# Altium footprint library 2020-09-26_17-27-19.PcbLib: 69 footprints (part 3 of 5)
Each footprint in its own frame and in the unit in brackets; x right, y up, seen from the top. Pads: shape width x height; smd on the part's side, far side on the other; paste and mask are expansions set on the pad; w line width, h text height; cw(c..) or ccw(c..) is an arc to the next point about the centre after c.
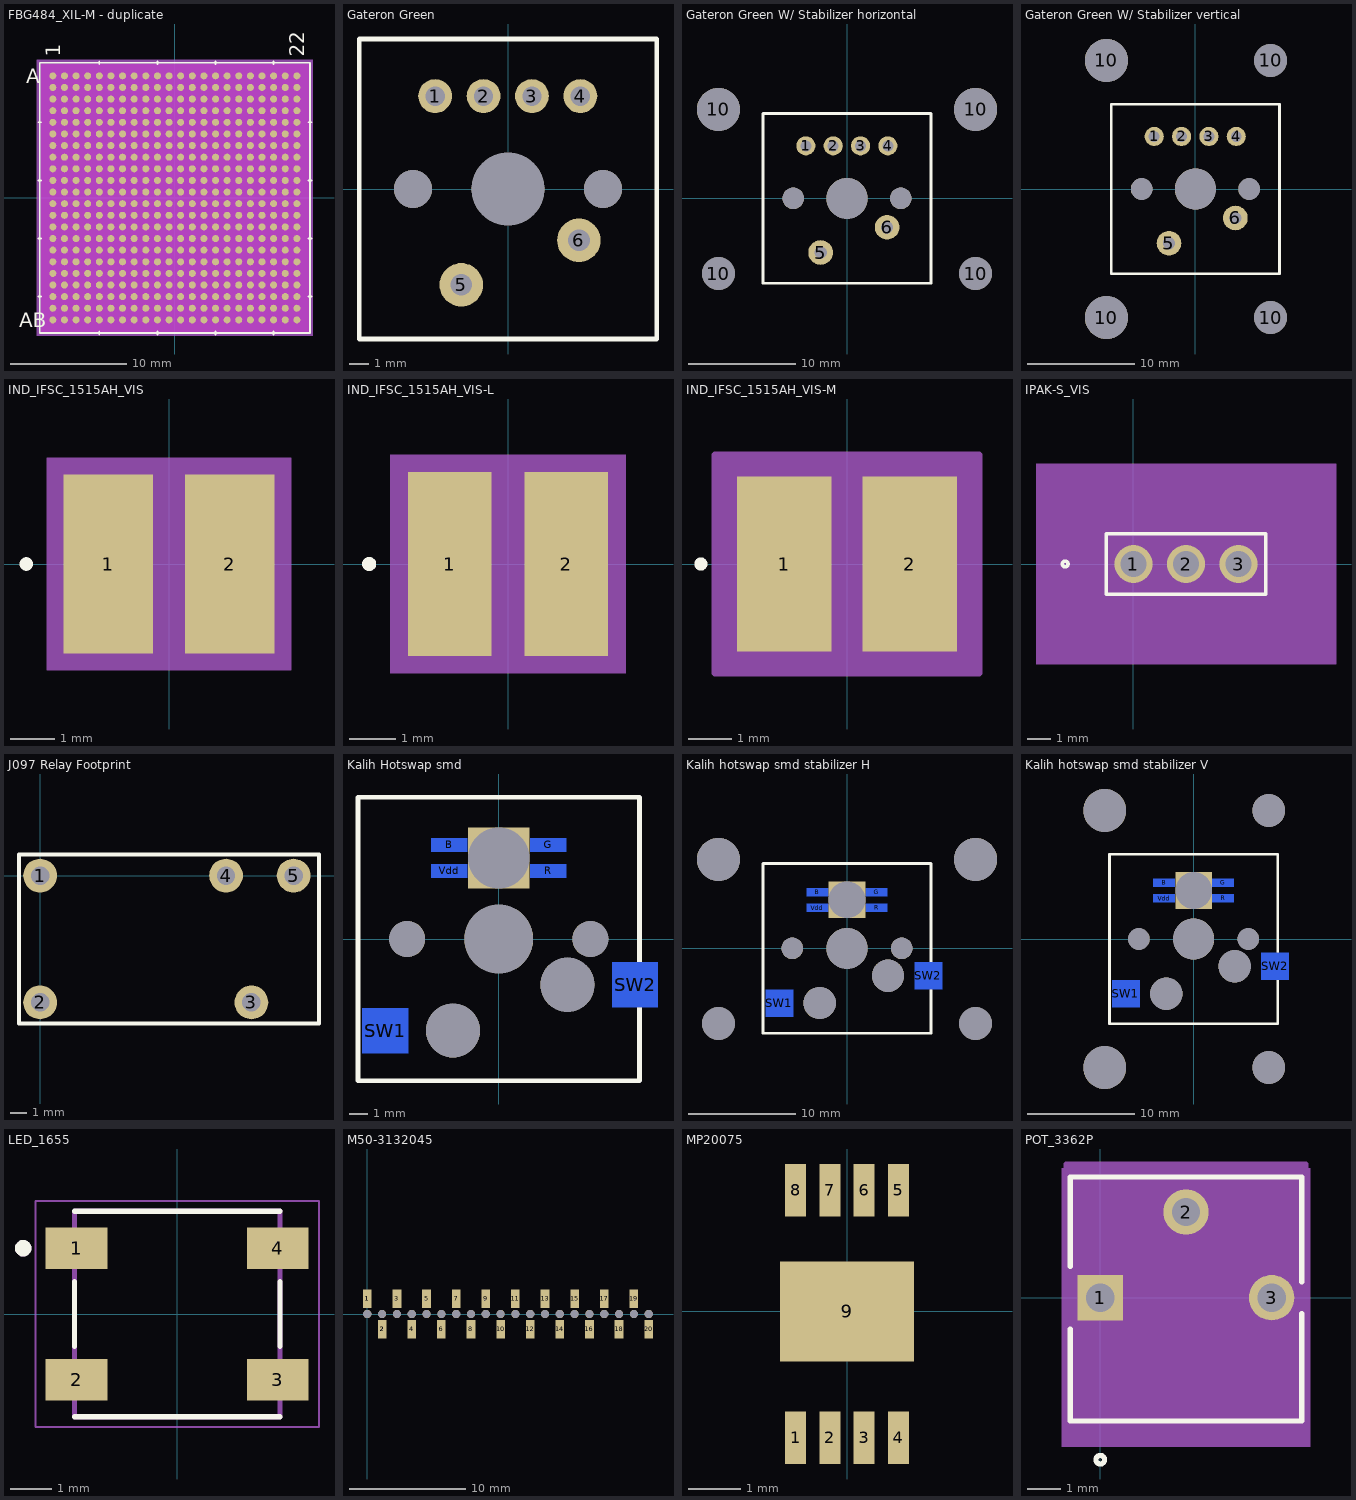
[diagram p2: the footprints below, top view; thin cyan lines are the x and y axes]

## FBG484_XIL-M - duplicate [mm]
pads (484):
  round 0.605 smd paste+0 mask+0: A1(-10.5,10.5) A2(-9.5,10.5) A3(-8.5,10.5) A4(-7.5,10.5) A5(-6.5,10.5) A6(-5.5,10.5) A7(-4.5,10.5) A8(-3.5,10.5) A9(-2.5,10.5) A10(-1.5,10.5) A11(-0.5,10.5) A12(0.5,10.5) A13(1.5,10.5) A14(2.5,10.5) A15(3.5,10.5) A16(4.5,10.5) A17(5.5,10.5) A18(6.5,10.5) A19(7.5,10.5) A20(8.5,10.5) A21(9.5,10.5) A22(10.5,10.5) AA1(-10.5,-9.5) AA2(-9.5,-9.5) AA3(-8.5,-9.5) AA4(-7.5,-9.5) AA5(-6.5,-9.5) AA6(-5.5,-9.5) AA7(-4.5,-9.5) AA8(-3.5,-9.5) AA9(-2.5,-9.5) AA10(-1.5,-9.5) AA11(-0.5,-9.5) AA12(0.5,-9.5) AA13(1.5,-9.5) AA14(2.5,-9.5) AA15(3.5,-9.5) AA16(4.5,-9.5) AA17(5.5,-9.5) AA18(6.5,-9.5) AA19(7.5,-9.5) AA20(8.5,-9.5) AA21(9.5,-9.5) AA22(10.5,-9.5) AB1(-10.5,-10.5) AB2(-9.5,-10.5) AB3(-8.5,-10.5) AB4(-7.5,-10.5) AB5(-6.5,-10.5) AB6(-5.5,-10.5) AB7(-4.5,-10.5) AB8(-3.5,-10.5) AB9(-2.5,-10.5) AB10(-1.5,-10.5) AB11(-0.5,-10.5) AB12(0.5,-10.5) AB13(1.5,-10.5) AB14(2.5,-10.5) AB15(3.5,-10.5) AB16(4.5,-10.5) AB17(5.5,-10.5) AB18(6.5,-10.5) AB19(7.5,-10.5) AB20(8.5,-10.5) AB21(9.5,-10.5) AB22(10.5,-10.5) B1(-10.5,9.5) B2(-9.5,9.5) B3(-8.5,9.5) B4(-7.5,9.5) B5(-6.5,9.5) B6(-5.5,9.5) B7(-4.5,9.5) B8(-3.5,9.5) B9(-2.5,9.5) B10(-1.5,9.5) B11(-0.5,9.5) B12(0.5,9.5) B13(1.5,9.5) B14(2.5,9.5) B15(3.5,9.5) B16(4.5,9.5) B17(5.5,9.5) B18(6.5,9.5) B19(7.5,9.5) B20(8.5,9.5) B21(9.5,9.5) B22(10.5,9.5) C1(-10.5,8.5) C2(-9.5,8.5) C3(-8.5,8.5) C4(-7.5,8.5) C5(-6.5,8.5) C6(-5.5,8.5) C7(-4.5,8.5) C8(-3.5,8.5) C9(-2.5,8.5) C10(-1.5,8.5) C11(-0.5,8.5) C12(0.5,8.5) C13(1.5,8.5) C14(2.5,8.5) C15(3.5,8.5) C16(4.5,8.5) C17(5.5,8.5) C18(6.5,8.5) C19(7.5,8.5) C20(8.5,8.5) C21(9.5,8.5) C22(10.5,8.5) D1(-10.5,7.5) D2(-9.5,7.5) D3(-8.5,7.5) D4(-7.5,7.5) D5(-6.5,7.5) D6(-5.5,7.5) D7(-4.5,7.5) D8(-3.5,7.5) D9(-2.5,7.5) D10(-1.5,7.5) D11(-0.5,7.5) D12(0.5,7.5) D13(1.5,7.5) D14(2.5,7.5) D15(3.5,7.5) D16(4.5,7.5) D17(5.5,7.5) D18(6.5,7.5) D19(7.5,7.5) D20(8.5,7.5) D21(9.5,7.5) D22(10.5,7.5) E1(-10.5,6.5) E2(-9.5,6.5) E3(-8.5,6.5) E4(-7.5,6.5) E5(-6.5,6.5) E6(-5.5,6.5) E7(-4.5,6.5) E8(-3.5,6.5) E9(-2.5,6.5) E10(-1.5,6.5) E11(-0.5,6.5) E12(0.5,6.5) E13(1.5,6.5) E14(2.5,6.5) E15(3.5,6.5) E16(4.5,6.5) E17(5.5,6.5) E18(6.5,6.5) E19(7.5,6.5) E20(8.5,6.5) E21(9.5,6.5) E22(10.5,6.5) F1(-10.5,5.5) F2(-9.5,5.5) F3(-8.5,5.5) F4(-7.5,5.5) F5(-6.5,5.5) F6(-5.5,5.5) F7(-4.5,5.5) F8(-3.5,5.5) F9(-2.5,5.5) F10(-1.5,5.5) F11(-0.5,5.5) F12(0.5,5.5) F13(1.5,5.5) F14(2.5,5.5) F15(3.5,5.5) F16(4.5,5.5) F17(5.5,5.5) F18(6.5,5.5) F19(7.5,5.5) F20(8.5,5.5) F21(9.5,5.5) F22(10.5,5.5) G1(-10.5,4.5) G2(-9.5,4.5) G3(-8.5,4.5) G4(-7.5,4.5) G5(-6.5,4.5) G6(-5.5,4.5) G7(-4.5,4.5) G8(-3.5,4.5) G9(-2.5,4.5) G10(-1.5,4.5) G11(-0.5,4.5) G12(0.5,4.5) G13(1.5,4.5) G14(2.5,4.5) G15(3.5,4.5) G16(4.5,4.5) G17(5.5,4.5) G18(6.5,4.5) G19(7.5,4.5) G20(8.5,4.5) G21(9.5,4.5) G22(10.5,4.5) H1(-10.5,3.5) H2(-9.5,3.5) H3(-8.5,3.5) H4(-7.5,3.5) H5(-6.5,3.5) H6(-5.5,3.5) H7(-4.5,3.5) H8(-3.5,3.5) H9(-2.5,3.5) H10(-1.5,3.5) H11(-0.5,3.5) H12(0.5,3.5) H13(1.5,3.5) H14(2.5,3.5) H15(3.5,3.5) H16(4.5,3.5) H17(5.5,3.5) H18(6.5,3.5) H19(7.5,3.5) H20(8.5,3.5) H21(9.5,3.5) H22(10.5,3.5) J1(-10.5,2.5) J2(-9.5,2.5) J3(-8.5,2.5) J4(-7.5,2.5) J5(-6.5,2.5) J6(-5.5,2.5) J7(-4.5,2.5) J8(-3.5,2.5) J9(-2.5,2.5) J10(-1.5,2.5) J11(-0.5,2.5) J12(0.5,2.5) J13(1.5,2.5) J14(2.5,2.5) J15(3.5,2.5) J16(4.5,2.5) J17(5.5,2.5) J18(6.5,2.5) J19(7.5,2.5) J20(8.5,2.5) J21(9.5,2.5) J22(10.5,2.5) K1(-10.5,1.5) K2(-9.5,1.5) K3(-8.5,1.5) K4(-7.5,1.5) K5(-6.5,1.5) K6(-5.5,1.5) K7(-4.5,1.5) K8(-3.5,1.5) K9(-2.5,1.5) K10(-1.5,1.5) K11(-0.5,1.5) K12(0.5,1.5) K13(1.5,1.5) K14(2.5,1.5) K15(3.5,1.5) K16(4.5,1.5) K17(5.5,1.5) K18(6.5,1.5) K19(7.5,1.5) K20(8.5,1.5) K21(9.5,1.5) K22(10.5,1.5) L1(-10.5,0.5) L2(-9.5,0.5) L3(-8.5,0.5) L4(-7.5,0.5) L5(-6.5,0.5) L6(-5.5,0.5) L7(-4.5,0.5) L8(-3.5,0.5) L9(-2.5,0.5) L10(-1.5,0.5) L11(-0.5,0.5) L12(0.5,0.5) L13(1.5,0.5) L14(2.5,0.5) L15(3.5,0.5) L16(4.5,0.5) L17(5.5,0.5) L18(6.5,0.5) L19(7.5,0.5) L20(8.5,0.5) L21(9.5,0.5) L22(10.5,0.5) M1(-10.5,-0.5) M2(-9.5,-0.5) M3(-8.5,-0.5) M4(-7.5,-0.5) M5(-6.5,-0.5) M6(-5.5,-0.5) M7(-4.5,-0.5) M8(-3.5,-0.5) M9(-2.5,-0.5) M10(-1.5,-0.5) M11(-0.5,-0.5) M12(0.5,-0.5) M13(1.5,-0.5) M14(2.5,-0.5) M15(3.5,-0.5) M16(4.5,-0.5) M17(5.5,-0.5) M18(6.5,-0.5) M19(7.5,-0.5) M20(8.5,-0.5) M21(9.5,-0.5) M22(10.5,-0.5) N1(-10.5,-1.5) N2(-9.5,-1.5) N3(-8.5,-1.5) N4(-7.5,-1.5) N5(-6.5,-1.5) N6(-5.5,-1.5) N7(-4.5,-1.5) N8(-3.5,-1.5) N9(-2.5,-1.5) N10(-1.5,-1.5) N11(-0.5,-1.5) N12(0.5,-1.5) N13(1.5,-1.5) N14(2.5,-1.5) N15(3.5,-1.5) N16(4.5,-1.5) N17(5.5,-1.5) N18(6.5,-1.5) N19(7.5,-1.5) N20(8.5,-1.5) N21(9.5,-1.5) N22(10.5,-1.5) P1(-10.5,-2.5) P2(-9.5,-2.5) P3(-8.5,-2.5) P4(-7.5,-2.5) P5(-6.5,-2.5) P6(-5.5,-2.5) P7(-4.5,-2.5) P8(-3.5,-2.5) P9(-2.5,-2.5) P10(-1.5,-2.5) P11(-0.5,-2.5) P12(0.5,-2.5) P13(1.5,-2.5) P14(2.5,-2.5) P15(3.5,-2.5) P16(4.5,-2.5) P17(5.5,-2.5) P18(6.5,-2.5) P19(7.5,-2.5) P20(8.5,-2.5) P21(9.5,-2.5) P22(10.5,-2.5) R1(-10.5,-3.5) R2(-9.5,-3.5) R3(-8.5,-3.5) R4(-7.5,-3.5) R5(-6.5,-3.5) R6(-5.5,-3.5) R7(-4.5,-3.5) R8(-3.5,-3.5) R9(-2.5,-3.5) R10(-1.5,-3.5) R11(-0.5,-3.5) R12(0.5,-3.5) R13(1.5,-3.5) R14(2.5,-3.5) R15(3.5,-3.5) R16(4.5,-3.5) R17(5.5,-3.5) R18(6.5,-3.5) R19(7.5,-3.5) R20(8.5,-3.5) R21(9.5,-3.5) R22(10.5,-3.5) T1(-10.5,-4.5) T2(-9.5,-4.5) T3(-8.5,-4.5) T4(-7.5,-4.5) T5(-6.5,-4.5) T6(-5.5,-4.5) T7(-4.5,-4.5) T8(-3.5,-4.5) T9(-2.5,-4.5) T10(-1.5,-4.5) T11(-0.5,-4.5) T12(0.5,-4.5) T13(1.5,-4.5) T14(2.5,-4.5) T15(3.5,-4.5) T16(4.5,-4.5) T17(5.5,-4.5) T18(6.5,-4.5) T19(7.5,-4.5) T20(8.5,-4.5) T21(9.5,-4.5) T22(10.5,-4.5) U1(-10.5,-5.5) U2(-9.5,-5.5) U3(-8.5,-5.5) U4(-7.5,-5.5) U5(-6.5,-5.5) U6(-5.5,-5.5) U7(-4.5,-5.5) U8(-3.5,-5.5) U9(-2.5,-5.5) U10(-1.5,-5.5) U11(-0.5,-5.5) U12(0.5,-5.5) U13(1.5,-5.5) U14(2.5,-5.5) U15(3.5,-5.5) U16(4.5,-5.5) U17(5.5,-5.5) U18(6.5,-5.5) U19(7.5,-5.5) U20(8.5,-5.5) U21(9.5,-5.5) U22(10.5,-5.5) V1(-10.5,-6.5) V2(-9.5,-6.5) V3(-8.5,-6.5) V4(-7.5,-6.5) V5(-6.5,-6.5) V6(-5.5,-6.5) V7(-4.5,-6.5) V8(-3.5,-6.5) V9(-2.5,-6.5) V10(-1.5,-6.5) V11(-0.5,-6.5) V12(0.5,-6.5) V13(1.5,-6.5) V14(2.5,-6.5) V15(3.5,-6.5) V16(4.5,-6.5) V17(5.5,-6.5) V18(6.5,-6.5) V19(7.5,-6.5) V20(8.5,-6.5) V21(9.5,-6.5) V22(10.5,-6.5) W1(-10.5,-7.5) W2(-9.5,-7.5) W3(-8.5,-7.5) W4(-7.5,-7.5) W5(-6.5,-7.5) W6(-5.5,-7.5) W7(-4.5,-7.5) W8(-3.5,-7.5) W9(-2.5,-7.5) W10(-1.5,-7.5) W11(-0.5,-7.5) W12(0.5,-7.5) W13(1.5,-7.5) W14(2.5,-7.5) W15(3.5,-7.5) W16(4.5,-7.5) W17(5.5,-7.5) W18(6.5,-7.5) W19(7.5,-7.5) W20(8.5,-7.5) W21(9.5,-7.5) W22(10.5,-7.5) Y1(-10.5,-8.5) Y2(-9.5,-8.5) Y3(-8.5,-8.5) Y4(-7.5,-8.5) Y5(-6.5,-8.5) Y6(-5.5,-8.5) Y7(-4.5,-8.5) Y8(-3.5,-8.5) Y9(-2.5,-8.5) Y10(-1.5,-8.5) Y11(-0.5,-8.5) Y12(0.5,-8.5) Y13(1.5,-8.5) Y14(2.5,-8.5) Y15(3.5,-8.5) Y16(4.5,-8.5) Y17(5.5,-8.5) Y18(6.5,-8.5) Y19(7.5,-8.5) Y20(8.5,-8.5) Y21(9.5,-8.5) Y22(10.5,-8.5)
Top Overlay:
  lines w0.152: -11.76,-8.5 -11.506,-8.5 ; -11.76,-3.5 -11.506,-3.5 ; -11.76,1.5 -11.506,1.5 ; -11.76,6.5 -11.506,6.5 ; -6.5,-11.76 -6.5,-11.506 ; -6.5,11.506 -6.5,11.76 ; -1.5,-11.76 -1.5,-11.506 ; -1.5,11.506 -1.5,11.76 ; 3.5,-11.76 3.5,-11.506 ; 3.5,11.506 3.5,11.76 ; 8.5,-11.76 8.5,-11.506 ; 8.5,11.506 8.5,11.76 ; 11.506,-8.5 11.76,-8.5 ; 11.506,-3.5 11.76,-3.5 ; 11.506,1.5 11.76,1.5 ; 11.506,6.5 11.76,6.5 ; -11.633,-11.633 -11.633,11.633 11.633,11.633 11.633,-11.633 -11.633,-11.633
  text "22" at 11.135,12.141 h1.27
  text "1" at -9.865,12.141 h1.27
  text "AB" at -13.411,-11.135 h1.27
  text "A" at -12.776,9.865 h1.27
Bottom Overlay:
  text "22" at 9.865,12.141 h1.27
  text "1" at -11.135,12.141 h1.27
  text "AB" at -12.141,-11.135 h1.27
  text "A" at -12.141,9.865 h1.27
Keep-Out Layer:
  region: -11.508,-11.508 -11.508,11.508 11.508,11.508 11.508,-11.508
Mechanical 5:
  region: 11.887,-11.887 -11.887,-11.887 -11.887,11.887 11.887,11.887
Mechanical 13:
  lines w0.025: -11.506,11.006 -11.006,11.506 ; -11.506,-11.506 -11.506,11.506 11.506,11.506 11.506,-11.506 -11.506,-11.506
  text "22" at 11.135,12.141 h1.27
  text "1" at -9.865,12.141 h1.27
  text "AB" at -13.411,-11.135 h1.27
  text "A" at -12.776,9.865 h1.27
Mechanical 15:
  region: 11.76,-11.76 -11.76,-11.76 -11.76,11.76 11.76,11.76
  lines w0.152: -11.76,-11.76 11.76,-11.76 11.76,11.76 -11.76,11.76 -11.76,-11.76
3D body "FBG484_XIL.step": height 1.27, standoff 0, extent -11.506,-11.506 11.506,11.506

## Gateron Green [mil]
pads (9):
  round 70 hole 40: 1(-150.51,192.01) 2(-50.51,192.01) 3(49.49,192.01) 4(149.5,192)
  round 90 hole 45: 5(-96.5,-198) 6(146.5,-105.99)
  round 78.74 hole 78.74: ""(-196.5,0) ""(196.5,0)
  round 150 hole 150: ""(0,0)
Top Overlay:
  lines w10: -307.5,-310 307.5,-310 307.5,310 -307.5,310 -307.5,-310
3D body "asm_mx_asm_PCB.stp": height 607.97, standoff -124.31, extent -306.81,-306.81 307.37,307.37

## Gateron Green W/ Stabilizer horizontal [mil] "1x2 cherry screw in stabilizer"
pads (13):
  round 70 hole 40: 1(-150.51,192.01) 2(-50.51,192.01) 3(49.49,192.01) 4(149.5,192)
  round 90 hole 45: 5(-96.5,-198) 6(146.5,-105.99)
  round 120 hole 120 unplated: 10(-470,-275) 10(470,-275)
  round 157.01 hole 157 unplated: 10(-470,325) 10(470,325)
  round 78.74 hole 78.74: ""(-196.5,0) ""(196.5,0)
  round 150 hole 150: ""(0,0)
Top Overlay:
  lines w10: -307.5,-310 307.5,-310 307.5,310 -307.5,310 -307.5,-310
3D body "asm_mx_asm_PCB.stp": height 607.97, standoff -124.31, extent -306.81,-306.81 307.37,307.37

## Gateron Green W/ Stabilizer vertical [mil] "1x2 cherry screw in stabilizer"
pads (13):
  round 70 hole 40: 1(-150.51,192.01) 2(-50.51,192.01) 3(49.49,192.01) 4(149.5,192)
  round 90 hole 45: 5(-96.5,-198) 6(146.5,-105.99)
  round 157.01 hole 157 unplated: 10(-325,-470) 10(-325,470)
  round 120 hole 120 unplated: 10(275,-470) 10(275,470)
  round 78.74 hole 78.74: ""(-196.5,0) ""(196.5,0)
  round 150 hole 150: ""(0,0)
Top Overlay:
  lines w10: -307.5,-310 -307.5,310 307.5,310 307.5,-310 -307.5,-310
3D body "asm_mx_asm_PCB.stp": height 607.97, standoff -124.31, extent -306.81,-306.81 307.37,307.37

## IND_IFSC_1515AH_VIS [mil]
pads (2):
  rect 79x158 smd paste+0 mask+0: 1(-53.5,0) 2(53.5,0)
Top Overlay:
  circle w6: c-126,0 r3
Mechanical 5:
  region: 108,-94 -108,-94 -108,94 108,94
Mechanical 13:
  circle w0: c-48.5,0 r3
  lines w1: -79,-79 -79,79 ; -79,-79 79,-79 ; -79,-79 -14,-79 -14,79 -79,79 ; -79,-79 -79,79 ; -79,79 79,79 ; 79,-79 79,79 ; 79,-79 79,79 ; 79,-79 14,-79 14,79 79,79
Mechanical 15:
  region: 103,-89 -103,-89 -103,89 103,89
  lines w6: -103,-89 103,-89 103,89 -103,89 -103,-89
3D body "IND_IFSC_1515AH_VIS.step": height 75, standoff 0, extent -79.02,-79.02 79.02,79.02

## IND_IFSC_1515AH_VIS-L [mil]
pads (2):
  rect 71x156 smd paste+0 mask+0: 1(-49.5,0) 2(49.5,0)
Top Overlay:
  circle w6: c-118,0 r3
Mechanical 5:
  region: 100,-93 -100,-93 -100,93 100,93
Mechanical 13:
  circle w0: c-44.5,0 r3
  lines w1: -79,-79 -79,79 ; -79,-79 -14,-79 -14,79 -79,79 ; -79,-79 79,-79 ; -79,-79 -79,79 ; -79,79 79,79 ; 79,-79 14,-79 14,79 79,79 ; 79,-79 79,79 ; 79,-79 79,79
Mechanical 15:
  region: 89,-82 -89,-82 -89,82 89,82
  lines w6: -89,-82 -89,82 89,82 89,-82 -89,-82
3D body "IND_IFSC_1515AH_VIS.step": height 75, standoff 0, extent -79.02,-79.02 79.02,79.02

## IND_IFSC_1515AH_VIS-M [mil]
pads (2):
  rect 87x160 smd paste+0 mask+0: 1(-57.5,0) 2(57.5,0)
Top Overlay:
  circle w6: c-134,0 r3
Mechanical 5:
  region: 116,-95 -116,-95 -116,95 116,95
Mechanical 13:
  circle w0: c-52.5,0 r3
  lines w1: -79,-79 -79,79 ; -79,-79 79,-79 ; -79,-79 -14,-79 -14,79 -79,79 ; -79,-79 -79,79 ; -79,79 79,79 ; 79,-79 79,79 ; 79,-79 79,79 ; 79,-79 14,-79 14,79 79,79
Mechanical 15:
  region: 121,-100 -121,-100 -121,100 121,100
  lines w6: -121,-100 121,-100 121,100 -121,100 -121,-100
3D body "IND_IFSC_1515AH_VIS.step": height 75, standoff 0, extent -79.02,-79.02 79.02,79.02

## IPAK-S_VIS [mil]
pads (3):
  round 65 hole 45 mask+0: 1(0,0) 2(90,0) 3(180,0)
Top Overlay:
  circle w6: c-117,0 r5
  lines w6: -47,-52 -47,52 227,52 227,-52 -47,-52
Mechanical 5:
  region: -167,172 347,172 347,-172 -167,-172
Mechanical 7:
  lines w1: 0,-107 0,-42.5 ; 100,0 282,0 222.5,0 ; 180,-107 180,-42.5 ; 0,-97 10,-102 10,-92 0,-97 ; 0,-97 180,-97 ; 180,-97 170,-102 170,-92 180,-97 ; 272,0 277,10 267,10 272,0 ; 272,0 277,-10 267,-10 272,0
  text "Alt 2 Padstyle: OX90Y60D30P" at -247.5,-437 h50
  text "Alt 1 Padstyle: OX60Y90D30P" at -247.5,-377 h50
  text "Pin 1 Padstyle: OX65Y65D0T" at -235,-317 h50
  text "Default Padstyle: OX65Y65D45P" at -272.5,-257 h50
Mechanical 13:
  circle w0: c-32,0 r5
  lines w1: -42,-3 222,-3 ; -42,-47 -42,47 222,47 222,-47 -42,-47
  text "TAB" at 71.25,9.5 h25
Mechanical 15:
  region: 232,57 -52,57 -52,-57 232,-57
  lines w6: -52,-57 232,-57 232,57 -52,57 -52,-57
3D body: height 10, standoff 0, extent 0,0 10,10

## J097 Relay Footprint [mil]
pads (5):
  round 80 hole 43.31: 1(0,0) 2(0,-300) 3(500,-300) 4(440,0) 5(600,0)
Top Overlay:
  lines w10: -50,-350 660,-350 660,50 -50,50 -50,-350

## Kalih Hotswap smd [mm]
pads (12):
  rect 2x0.75 smd far side: B(-2.75,5.225) G(2.75,5.225) R(2.75,3.775) Vdd(-2.75,3.775)
  rect 2.55x2.5 smd far side: SW1(-6.29,-5.08) SW2(7.56,-2.54)
  round 2 hole 2: ""(-5.08,0) ""(5.08,0)
  round 3 hole 3 unplated: ""(-2.54,-5.08) ""(3.81,-2.54)
  round 3.81 hole 3.81: ""(0,0)
  rect 3.4x3.4 hole 3.4 square unplated: ""(0,4.5)
Top Overlay:
  lines w0.254: -7.81,-7.874 -7.81,7.874 7.81,7.874 7.81,-7.874 -7.81,-7.874
3D body "asm_mx_asm_PCB.stp": height 15.44, standoff -3.16, extent -7.793,-7.793 7.807,7.807

## Kalih hotswap smd stabilizer H [mm] "1x2 cherry screw in stabilizer"
pads (16):
  rect 2x0.75 smd far side: B(-2.75,5.225) G(2.75,5.225) R(2.75,3.775) Vdd(-2.75,3.775)
  rect 2.55x2.5 smd far side: SW1(-6.29,-5.08) SW2(7.56,-2.54)
  round 3.048 hole 3.048 unplated: ""(-11.938,-6.985) ""(11.938,-6.985)
  round 3.988 hole 3.988 unplated: ""(-11.938,8.255) ""(11.938,8.255)
  round 2 hole 2: ""(-5.08,0) ""(5.08,0)
  round 3 hole 3 unplated: ""(-2.54,-5.08) ""(3.81,-2.54)
  round 3.81 hole 3.81: ""(0,0)
  rect 3.4x3.4 hole 3.4 square unplated: ""(0,4.5)
Top Overlay:
  lines w0.254: -7.81,-7.874 7.81,-7.874 7.81,7.874 -7.81,7.874 -7.81,-7.874
3D body "asm_mx_asm_PCB.stp": height 15.44, standoff -3.16, extent -7.793,-7.793 7.807,7.807

## Kalih hotswap smd stabilizer V [mm] "1x2 cherry screw in stabilizer"
pads (16):
  rect 2x0.75 smd far side: B(-2.75,5.225) G(2.75,5.225) R(2.75,3.775) Vdd(-2.75,3.775)
  rect 2.55x2.5 smd far side: SW1(-6.29,-5.08) SW2(7.56,-2.54)
  round 3.988 hole 3.988 unplated: ""(-8.255,-11.938) ""(-8.255,11.938)
  round 2 hole 2: ""(-5.08,0) ""(5.08,0)
  round 3 hole 3 unplated: ""(-2.54,-5.08) ""(3.81,-2.54)
  round 3.81 hole 3.81: ""(0,0)
  rect 3.4x3.4 hole 3.4 square unplated: ""(0,4.5)
  round 3.048 hole 3.048 unplated: ""(6.985,-11.938) ""(6.985,11.938)
Top Overlay:
  lines w0.254: -7.81,-7.874 -7.81,7.874 7.81,7.874 7.81,-7.874 -7.81,-7.874
3D body "asm_mx_asm_PCB.stp": height 15.44, standoff -3.16, extent -7.793,-7.793 7.807,7.807

## LED_1655 [mm]
pads (4):
  rect 1.5x1 smd: 1(-2.45,1.6) 2(-2.45,-1.6) 3(2.45,-1.6) 4(2.45,1.6)
Top Overlay:
  circle w0.2: c-3.75,1.6 r0.1
  lines w0.127: -2.5,-2.5 2.5,-2.5 ; -2.5,-0.787 -2.5,0.787 ; -2.5,2.5 2.5,2.5 ; 2.5,-0.787 2.5,0.787
Mechanical 13:
  circle w0.2: c-3.75,1.6 r0.1
  lines w0.127: -2.5,-2.5 -2.5,2.5 2.5,2.5 2.5,-2.5 -2.5,-2.5
Mechanical 15:
  lines w0.05: -3.45,-2.75 -3.45,2.75 3.45,2.75 3.45,-2.75 -3.45,-2.75
3D body "WS2812b.STEP": height 1.7, standoff 0, extent -2.7,-2.499 2.7,2.501

## M50-3132045 [mm] "M50-3132045 20pos header passthru"
pads (44):
  rect 0.74x1.6 smd: 1(0,1.3) 1(0,1.3) 2(1.27,-1.3) 2(1.27,-1.3) 3(2.54,1.3) 4(3.81,-1.3) 5(5.08,1.3) 6(6.35,-1.3) 7(7.62,1.3) 8(8.89,-1.3) 9(10.16,1.3) 10(11.43,-1.3) 11(12.7,1.3) 12(13.97,-1.3) 13(15.24,1.3) 14(16.51,-1.3) 15(17.78,1.3) 16(19.05,-1.3) 17(20.32,1.3) 18(21.59,-1.3) 19(22.86,1.3) 20(24.13,-1.3)
  round 0.7 hole 0.7: ""(0,0) ""(0,0) ""(1.27,0) ""(1.27,0) ""(2.54,0) ""(3.81,0) ""(5.08,0) ""(6.35,0) ""(7.62,0) ""(8.89,0) ""(10.16,0) ""(11.43,0) ""(12.7,0) ""(13.97,0) ""(15.24,0) ""(16.51,0) ""(17.78,0) ""(19.05,0) ""(20.32,0) ""(21.59,0) ""(22.86,0) ""(24.13,0)
3D body "M50-3132045_asm.stp": height 2, standoff -0.1, extent -0.85,-1.549 24.95,1.549

## MP20075 [mm]
pads (9):
  rect 0.4x1 smd: 1(-0.975,-2.4) 2(-0.325,-2.4) 3(0.325,-2.4) 4(0.975,-2.4) 5(0.975,2.3) 6(0.325,2.3) 7(-0.325,2.3) 8(-0.975,2.3)
  rect 2.54x1.9 smd: 9(0,0)
3D body "TSOP MP20075.step": height 1.1, standoff 0, extent -1.55,-2.45 1.55,2.45

## POT_3362P [mil]
pads (3):
  rect 53x53 hole 33 mask+0: 1(0,0)
  round 53 hole 33 mask+0: 2(100,100) 3(200,0)
Top Overlay:
  circle w6: c0,-189 r5
  lines w6: -35,-36.47 -35,-144 235,-144 235,-18.52 ; -35,36.47 -35,141 235,141 235,18.52
Mechanical 5:
  region: -45,151 245,151 245,-174 -45,-174
Mechanical 13:
  circle w0: c0,-129 r5
  lines w1: -30,-139 -30,136 230,136 230,-139 -30,-139
Mechanical 15:
  region: 240,-159 -40,-159 -40,156 240,156
  lines w6: -40,-159 240,-159 240,156 -40,156 -40,-159
3D body: height 10, standoff 0, extent 0,0 10,10
3D body "3362P001XXX0A.stp": height 188.98, standoff -211.02, extent -30,-139.19 230,135.81